# Altium integrated library LEMO Unipole And Multipole Type Connectors.IntLib: 1566 symbols (part 6 of 13) (continued)
## HEN.2F.319.MLNP
designator J?
Fixed receptacle, nut fixing, for printed circuit (back panel mounting), Key (N), 2F series, Multipole Type with 19 Contacts; Manufacturer: LEMO; PartNumber: HEN.2F.319.MLNP; Number of contacts: 19; Contact Diameter: 0.7 mm; AWG: 24; Test voltage Contact-Contact(Kv rms): 1.55; Test voltage Contact-Shell(Kv rms): 1.65; Rate Current(A): 5; DatasheetVersion: Jun-14; PackageReference: HEN.2F.319.MLNP; PackageDescription: Fixed receptacle, nut fixing, for printed circuit (back panel mounting), Key(N) for Printed Circuit; Supplier 1: Mouser; Supplier Part Number 1: 736-HEN2F319MLNP; Supplier 2: Digi-Key; Supplier Part Number 2: HEN.2F.319.MLNP-ND; ComponentLink1Description: Manufacturer URL; ComponentLink1URL: http://www.lemo.com; ComponentLink2Description: Datasheet; ComponentLink2URL: http://intra.lemo.ch/catalog/ROW/UK_English/f_series.pdf
footprint HEN.2F.319.MLNP (Socket, Female, Body 16mm dia. Height 21.6 mm, Through hole)
pins: 1, 2, 3, 4, 5, 6, 7, 8, 9, 10, 11, 12, 13, 14, 15, 16, 17, 18, 19, 21, 22, 23, 24

## HEN.2F.319.XLNP
designator J?
Fixed receptacle, nut fixing, for printed circuit (back panel mounting), Key (N), 2F series, Multipole Type with 19 Contacts; Manufacturer: LEMO; PartNumber: HEN.2F.319.XLNP; Number of contacts: 19; Contact Diameter: 0.7 mm; AWG: 24; Test voltage Contact-Contact(Kv rms): 1.55; Test voltage Contact-Shell(Kv rms): 1.65; Rate Current(A): 5; DatasheetVersion: Jun-14; PackageReference: HEN.2F.319.XLNP; PackageDescription: Fixed receptacle, nut fixing, for printed circuit (back panel mounting), Key(N) for Printed Circuit; Supplier 1: Mouser; Supplier Part Number 1: 736-HEN2F319XLNP; Supplier 2: Newark; Supplier Part Number 2: 28R4723; Supplier 3: Digi-Key; Supplier Part Number 3: HEN.2F.319.XLNP-ND; ComponentLink1Description: Manufacturer URL; ComponentLink1URL: http://www.lemo.com; ComponentLink2Description: Datasheet; ComponentLink2URL: http://intra.lemo.ch/catalog/ROW/UK_English/f_series.pdf
footprint HEN.2F.319.XLNP (Socket, Female, Body 16mm dia. Height 21.6 mm, Through hole)
pins: 1, 2, 3, 4, 5, 6, 7, 8, 9, 10, 11, 12, 13, 14, 15, 16, 17, 18, 19, 21, 22, 23, 24

## HEN.2F.319.XLNZ
designator J?
Fixed receptacle, nut fixing for printed circuit, Key (N), 2F series, Multipole Type with 19 Contacts; Manufacturer: LEMO; PartNumber: HEN.2F.319.XLNZ; Number of contacts: 19; Contact Diameter: 0.7 mm; AWG: 24; Test voltage Contact-Contact(Kv rms): 1.55; Test voltage Contact-Shell(Kv rms): 1.65; Rate Current(A): 5; DatasheetVersion: Jun-14; PackageReference: HEN.2F.319.XLNZ; PackageDescription: Fixed receptacle, nut fixing for printed circuit, Key(N) for Printed Circuit; ComponentLink1Description: Manufacturer URL; ComponentLink1URL: http://www.lemo.com; ComponentLink2Description: Datasheet; ComponentLink2URL: http://intra.lemo.ch/catalog/ROW/UK_English/f_series.pdf
footprint HEN.2F.319.XLNZ (Socket, Female, Through hole)
pins: 1, 2, 3, 4, 5, 6, 7, 8, 9, 10, 11, 12, 13, 14, 15, 16, 17, 18, 19, 21, 22, 23, 24

## HEN.2M.308.XLNP
designator J?
Fixed receptacle, nut fixing for printed circuit, watertight, Key (N), 2M series, Multipole Type with 8 Contacts; Manufacturer: LEMO; PartNumber: HEN.2M.308.XLNP; Number of contacts: 8; Contact Diameter: 0.9 mm; AWG: 22; Rated Current(A): 10; DatasheetVersion: Jun-14; PackageReference: HEN.2M.308.XLNP; PackageDescription: Fixed receptacle, nut fixing for printed circuit, watertight, Key(N) for Printed Circuit; Supplier 1: Mouser; Supplier Part Number 1: 736-HEN2M308XLNP; Supplier 2: Digi-Key; Supplier Part Number 2: 1124-1197-ND; ComponentLink1Description: Manufacturer URL; ComponentLink1URL: http://www.lemo.com; ComponentLink2Description: Datasheet; ComponentLink2URL: http://intra.lemo.ch/catalog/ROW/UK_English/M_series.pdf
footprint HEN.2M.308.XLNP (Socket, Female, Body 17mm dia. Height 20.8 mm, Through hole)
pins: 1, 2, 3, 4, 5, 6, 7, 8, 10, 11, 12, 13

## HEN.2M.310.XLNP
designator J?
Fixed receptacle, nut fixing for printed circuit, watertight, Key (N), 2M series, Multipole Type with 10 Contacts; Manufacturer: LEMO; PartNumber: HEN.2M.310.XLNP; Number of contacts: 10; Contact Diameter: 0.9 mm; AWG: 22; Rated Current(A): 8; DatasheetVersion: Jun-14; PackageReference: HEN.2M.310.XLNP; PackageDescription: Fixed receptacle, nut fixing for printed circuit, watertight, Key(N) for Printed Circuit; Supplier 1: Mouser; Supplier Part Number 1: 736-HEN2M310XLNP; Supplier 2: Digi-Key; Supplier Part Number 2: HEN.2M.310.XLNP-ND; ComponentLink1Description: Manufacturer URL; ComponentLink1URL: http://www.lemo.com; ComponentLink2Description: Datasheet; ComponentLink2URL: http://intra.lemo.ch/catalog/ROW/UK_English/M_series.pdf
footprint HEN.2M.310.XLNP (Socket, Female, Body 17mm dia. Height 20.8 mm, Through hole)
pins: 1, 2, 3, 4, 5, 6, 7, 8, 9, 10, 12, 13, 14, 15

## HEN.2M.312.XLNP
designator J?
Fixed receptacle, nut fixing for printed circuit, watertight, Key (N), 2M series, Multipole Type with 12 Contacts; Manufacturer: LEMO; PartNumber: HEN.2M.312.XLNP; Number of contacts: 12; Contact Diameter: 0.7 mm; AWG: 24; Rated Current(A): 7; DatasheetVersion: Jun-14; PackageReference: HEN.2M.312.XLNP; PackageDescription: Fixed receptacle, nut fixing for printed circuit, watertight, Key(N) for Printed Circuit; Supplier 1: Mouser; Supplier Part Number 1: 736-HEN2M312XLNP; Supplier 2: Farnell; Supplier Part Number 2: 2077488; Supplier 3: Digi-Key; Supplier Part Number 3: 1124-1198-ND; ComponentLink1Description: Manufacturer URL; ComponentLink1URL: http://www.lemo.com; ComponentLink2Description: Datasheet; ComponentLink2URL: http://intra.lemo.ch/catalog/ROW/UK_English/M_series.pdf
footprint HEN.2M.312.XLNP (Socket, Female, Body 17mm dia. Height 20.8 mm, Through hole)
pins: 1, 2, 3, 4, 5, 6, 7, 8, 9, 10, 11, 12, 14, 15, 16, 17

## HEN.2M.319.CLNP
designator J?
Fixed receptacle, nut fixing for printed circuit, watertight, Key (N), 2M series, Multipole Type with 19 Contacts; Manufacturer: LEMO; PartNumber: HEN.2M.319.CLNP; Number of contacts: 19; Contact Diameter: 0.7 mm; AWG: 24; Rated Current(A): 5; DatasheetVersion: Jun-14; PackageReference: HEN.2M.319.CLNP; PackageDescription: Fixed receptacle, nut fixing for printed circuit, watertight, Key(N) for Printed Circuit; ComponentLink1Description: Manufacturer URL; ComponentLink1URL: http://www.lemo.com; ComponentLink2Description: Datasheet; ComponentLink2URL: http://intra.lemo.ch/catalog/ROW/UK_English/M_series.pdf
footprint HEN.2M.319.CLNP (Socket, Female, Body 17mm dia. Height 20.8 mm, Through hole)
pins: 1, 2, 3, 4, 5, 6, 7, 8, 9, 10, 11, 12, 13, 14, 15, 16, 17, 18, 19, 21, 22, 23, 24

## HEN.2M.319.XLNP
designator J?
Fixed receptacle, nut fixing for printed circuit, watertight, Key (N), 2M series, Multipole Type with 19 Contacts; Manufacturer: LEMO; PartNumber: HEN.2M.319.XLNP; Number of contacts: 19; Contact Diameter: 0.7 mm; AWG: 24; Rated Current(A): 5; DatasheetVersion: Jun-14; PackageReference: HEN.2M.319.XLNP; PackageDescription: Fixed receptacle, nut fixing for printed circuit, watertight, Key(N) for Printed Circuit; Supplier 1: Mouser; Supplier Part Number 1: 736-HEN2M319XLNP; Supplier 2: Newark; Supplier Part Number 2: 28W2575; Supplier 3: Farnell; Supplier Part Number 3: 2077489; Supplier 4: Digi-Key; Supplier Part Number 4: HEN.2M.319.XLNP-ND; ComponentLink1Description: Manufacturer URL; ComponentLink1URL: http://www.lemo.com; ComponentLink2Description: Datasheet; ComponentLink2URL: http://intra.lemo.ch/catalog/ROW/UK_English/M_series.pdf
footprint HEN.2M.319.XLNP (Socket, Female, Body 17mm dia. Height 20.8 mm, Through hole)
pins: 1, 2, 3, 4, 5, 6, 7, 8, 9, 10, 11, 12, 13, 14, 15, 16, 17, 18, 19, 21, 22, 23, 24

## HEN.3F.322.CLNP
designator J?
Fixed receptacle, nut fixing, for printed circuit (back panel mounting), Key (N), 3F series, Multipole Type with 22 Contacts; Manufacturer: LEMO; PartNumber: HEN.3F.322.CLNP; Number of contacts: 22; Contact Diameter: 0.7 mm; AWG: 24; Test voltage Contact-Contact(Kv rms): 1.7; Test voltage Contact-Shell(Kv rms): 1.45; Rate Current(A): 5.5; DatasheetVersion: Jun-14; PackageReference: HEN.3F.322.CLNP; PackageDescription: Fixed receptacle, nut fixing, for printed circuit (back panel mounting), Key(N) for Printed Circuit; ComponentLink1Description: Manufacturer URL; ComponentLink1URL: http://www.lemo.com; ComponentLink2Description: Datasheet; ComponentLink2URL: http://intra.lemo.ch/catalog/ROW/UK_English/f_series.pdf
footprint HEN.3F.322.CLNP (Socket, Female, Body 18mm dia. Height 21.6 mm, Through hole)
pins: 1, 2, 3, 4, 5, 6, 7, 8, 9, 10, 11, 12, 13, 14, 15, 16, 17, 18, 19, 20, 21, 22, 24, 25, 26, 27

## HEN.3F.322.XLNP
designator J?
Fixed receptacle, nut fixing, for printed circuit (back panel mounting), Key (N), 3F series, Multipole Type with 22 Contacts; Manufacturer: LEMO; PartNumber: HEN.3F.322.XLNP; Number of contacts: 22; Contact Diameter: 0.7 mm; AWG: 24; Test voltage Contact-Contact(Kv rms): 1.7; Test voltage Contact-Shell(Kv rms): 1.45; Rate Current(A): 5.5; DatasheetVersion: Jun-14; PackageReference: HEN.3F.322.XLNP; PackageDescription: Fixed receptacle, nut fixing, for printed circuit (back panel mounting), Key(N) for Printed Circuit; Supplier 1: Mouser; Supplier Part Number 1: 736-HEN3F322XLNP; Supplier 2: Digi-Key; Supplier Part Number 2: HEN.3F.322.XLNP-ND; ComponentLink1Description: Manufacturer URL; ComponentLink1URL: http://www.lemo.com; ComponentLink2Description: Datasheet; ComponentLink2URL: http://intra.lemo.ch/catalog/ROW/UK_English/f_series.pdf
footprint HEN.3F.322.XLNP (Socket, Female, Body 18mm dia. Height 21.6 mm, Through hole)
pins: 1, 2, 3, 4, 5, 6, 7, 8, 9, 10, 11, 12, 13, 14, 15, 16, 17, 18, 19, 20, 21, 22, 24, 25, 26, 27

## HEN.3F.322.XLNPS
designator J?
Fixed receptacle, nut fixing, for printed circuit (back panel mounting), Key (N), 3F series, Multipole Type with 22 Contacts; Manufacturer: LEMO; PartNumber: HEN.3F.322.XLNPS; Number of contacts: 22; Contact Diameter: 0.7 mm; AWG: 24; Test voltage Contact-Contact(Kv rms): 1.7; Test voltage Contact-Shell(Kv rms): 1.45; Rate Current(A): 5.5; DatasheetVersion: Jun-14; PackageReference: HEN.3F.322.XLNPS; PackageDescription: Fixed receptacle, nut fixing, for printed circuit (back panel mounting), Key(N) for Printed Circuit; ComponentLink1Description: Manufacturer URL; ComponentLink1URL: http://www.lemo.com; ComponentLink2Description: Datasheet; ComponentLink2URL: http://intra.lemo.ch/catalog/ROW/UK_English/f_series.pdf
footprint HEN.3F.322.XLNPS (Socket, Female, Body 18mm dia. Height 21.6 mm, Through hole)
pins: 1, 2, 3, 4, 5, 6, 7, 8, 9, 10, 11, 12, 13, 14, 15, 16, 17, 18, 19, 20, 21, 22, 24, 25, 26, 27

## HEN.3F.330.CLNP
designator J?
Fixed receptacle, nut fixing, for printed circuit (back panel mounting), Key (N), 3F series, Multipole Type with 30 Contacts; Manufacturer: LEMO; PartNumber: HEN.3F.330.CLNP; Number of contacts: 30; Contact Diameter: 0.7 mm; AWG: 24; Test voltage Contact-Contact(Kv rms): 1.35; Test voltage Contact-Shell(Kv rms): 1.2; Rate Current(A): 3.5; DatasheetVersion: Jun-14; PackageReference: HEN.3F.330.CLNP; PackageDescription: Fixed receptacle, nut fixing, for printed circuit (back panel mounting), Key(N) for Printed Circuit; ComponentLink1Description: Manufacturer URL; ComponentLink1URL: http://www.lemo.com; ComponentLink2Description: Datasheet; ComponentLink2URL: http://intra.lemo.ch/catalog/ROW/UK_English/f_series.pdf
footprint HEN.3F.330.CLNP (Socket, Female, Body 18mm dia. Height 21.6 mm, Through hole)
pins: 1, 2, 3, 4, 5, 6, 7, 8, 9, 10, 11, 12, 13, 14, 15, 16, 17, 18, 19, 20, 21, 22, 23, 24, 25, 26, 27, 28, 29, 30, 32, 33, 34, 35

## HEN.3F.330.XLNP
designator J?
Fixed receptacle, nut fixing, for printed circuit (back panel mounting), Key (N), 3F series, Multipole Type with 30 Contacts; Manufacturer: LEMO; PartNumber: HEN.3F.330.XLNP; Number of contacts: 30; Contact Diameter: 0.7 mm; AWG: 24; Test voltage Contact-Contact(Kv rms): 1.35; Test voltage Contact-Shell(Kv rms): 1.2; Rate Current(A): 3.5; DatasheetVersion: Jun-14; PackageReference: HEN.3F.330.XLNP; PackageDescription: Fixed receptacle, nut fixing, for printed circuit (back panel mounting), Key(N) for Printed Circuit; Supplier 1: Mouser; Supplier Part Number 1: 736-HEN3F330XLNP; Supplier 2: Newark; Supplier Part Number 2: 38T2389; Supplier 3: Digi-Key; Supplier Part Number 3: HEN.3F.330.XLNP-ND; ComponentLink1Description: Manufacturer URL; ComponentLink1URL: http://www.lemo.com; ComponentLink2Description: Datasheet; ComponentLink2URL: http://intra.lemo.ch/catalog/ROW/UK_English/f_series.pdf
footprint HEN.3F.330.XLNP (Socket, Female, Body 18mm dia. Height 21.6 mm, Through hole)
pins: 1, 2, 3, 4, 5, 6, 7, 8, 9, 10, 11, 12, 13, 14, 15, 16, 17, 18, 19, 20, 21, 22, 23, 24, 25, 26, 27, 28, 29, 30, 32, 33, 34, 35

## HEN.3F.330.XLNPS
designator J?
Fixed receptacle, nut fixing, for printed circuit (back panel mounting), Key (N), 3F series, Multipole Type with 30 Contacts; Manufacturer: LEMO; PartNumber: HEN.3F.330.XLNPS; Number of contacts: 30; Contact Diameter: 0.7 mm; AWG: 24; Test voltage Contact-Contact(Kv rms): 1.35; Test voltage Contact-Shell(Kv rms): 1.2; Rate Current(A): 3.5; DatasheetVersion: Jun-14; PackageReference: HEN.3F.330.XLNPS; PackageDescription: Fixed receptacle, nut fixing, for printed circuit (back panel mounting), Key(N) for Printed Circuit; Supplier 1: Mouser; Supplier Part Number 1: 736-HEN.3F.330.XLNPS; Supplier 2: Newark; Supplier Part Number 2: 66T8368; Supplier 3: Digi-Key; Supplier Part Number 3: HEN.3F.330.XLNPS-ND; ComponentLink1Description: Manufacturer URL; ComponentLink1URL: http://www.lemo.com; ComponentLink2Description: Datasheet; ComponentLink2URL: http://intra.lemo.ch/catalog/ROW/UK_English/f_series.pdf
footprint HEN.3F.330.XLNPS (Socket, Female, Body 18mm dia. Height 21.6 mm, Through hole)
pins: 1, 2, 3, 4, 5, 6, 7, 8, 9, 10, 11, 12, 13, 14, 15, 16, 17, 18, 19, 20, 21, 22, 23, 24, 25, 26, 27, 28, 29, 30, 32, 33, 34, 35

## HEN.3M.322.XLNP
designator J?
Fixed receptacle, nut fixing for printed circuit, watertight, Key (N), 3M series, Multipole Type with 22 Contacts; Manufacturer: LEMO; PartNumber: HEN.3M.322.XLNP; Number of contacts: 22; Contact Diameter: 0.7 mm; AWG: 24; Rated Current(A): 4; DatasheetVersion: Jun-14; PackageReference: HEN.3M.322.XLNP; PackageDescription: Fixed receptacle, nut fixing for printed circuit, watertight, Key(N) for Printed Circuit; ComponentLink1Description: Manufacturer URL; ComponentLink1URL: http://www.lemo.com; ComponentLink2Description: Datasheet; ComponentLink2URL: http://intra.lemo.ch/catalog/ROW/UK_English/M_series.pdf
footprint HEN.3M.322.XLNP (Socket, Female, Body 19mm dia. Height 20.8 mm, Through hole)
pins: 1, 2, 3, 4, 5, 6, 7, 8, 9, 10, 11, 12, 13, 14, 15, 16, 17, 18, 19, 20, 21, 22, 24, 25, 26, 27

## HEN.3M.330.XLNP
designator J?
Fixed receptacle, nut fixing for printed circuit, watertight, Key (N), 3M series, Multipole Type with 30 Contacts; Manufacturer: LEMO; PartNumber: HEN.3M.330.XLNP; Number of contacts: 30; Contact Diameter: 0.7 mm; AWG: 24; Rated Current(A): 3.5; DatasheetVersion: Jun-14; PackageReference: HEN.3M.330.XLNP; PackageDescription: Fixed receptacle, nut fixing for printed circuit, watertight, Key(N) for Printed Circuit; Supplier 1: Mouser; Supplier Part Number 1: 736-HEN3M330XLNP; Supplier 2: Newark; Supplier Part Number 2: 47W6199; Supplier 3: Digi-Key; Supplier Part Number 3: 1124-1199-ND; ComponentLink1Description: Manufacturer URL; ComponentLink1URL: http://www.lemo.com; ComponentLink2Description: Datasheet; ComponentLink2URL: http://intra.lemo.ch/catalog/ROW/UK_English/M_series.pdf
footprint HEN.3M.330.XLNP (Socket, Female, Body 19mm dia. Height 20.8 mm, Through hole)
pins: 1, 2, 3, 4, 5, 6, 7, 8, 9, 10, 11, 12, 13, 14, 15, 16, 17, 18, 19, 20, 21, 22, 23, 24, 25, 26, 27, 28, 29, 30, 32, 33, 34, 35

## HEN.FF.303.XLNP
designator J?
Fixed receptacle, nut fixing, for printed circuit (back panel mounting), Key (N), FF series, Multipole Type with; Manufacturer: LEMO; PartNumber: HEN.FF.303.XLNP; Number of contacts: 0; Contact Diameter: 0.5 mm; AWG: 28; Test voltage Contact-Contact(Kv rms): 1.35; Test voltage Contact-Shell(Kv rms): 1.1; Rate Current(A): 3; DatasheetVersion: Jun-14; PackageReference: HEN.FF.303.XLNP; PackageDescription: Fixed receptacle, nut fixing, for printed circuit (back panel mounting), Key(N) for Printed Circuit; ComponentLink1Description: Manufacturer URL; ComponentLink1URL: http://www.lemo.com; ComponentLink2Description: Datasheet; ComponentLink2URL: http://intra.lemo.ch/catalog/ROW/UK_English/f_series.pdf
footprint HEN.FF.303.XLNP (Socket, Female, Through hole)
pins: 1, 2, 3, 5, 6, 7, 8

## HEN.FF.304.SLNP
designator J?
Fixed receptacle, nut fixing, for printed circuit (back panel mounting), Key (N), FF series, Multipole Type with; Manufacturer: LEMO; PartNumber: HEN.FF.304.SLNP; Number of contacts: 0; Contact Diameter: 0.5 mm; AWG: 28; Test voltage Contact-Contact(Kv rms): 1.05; Rate Current(A): 2; DatasheetVersion: Jun-14; PackageReference: HEN.FF.304.SLNP; PackageDescription: Fixed receptacle, nut fixing, for printed circuit (back panel mounting), Key(N) for Printed Circuit; Test voltage Contact-Shell(Kv rms): 1.05; ComponentLink1Description: Manufacturer URL; ComponentLink1URL: http://www.lemo.com; ComponentLink2Description: Datasheet; ComponentLink2URL: http://intra.lemo.ch/catalog/ROW/UK_English/f_series.pdf
footprint HEN.FF.304.SLNP (Socket, Female, Through hole)
pins: 1, 2, 3, 4, 6, 7, 8, 9

## HEN.FF.304.XLNP
designator J?
Fixed receptacle, nut fixing, for printed circuit (back panel mounting), Key (N), FF series, Multipole Type with; Manufacturer: LEMO; PartNumber: HEN.FF.304.XLNP; Number of contacts: 0; Contact Diameter: 0.5 mm; AWG: 28; Test voltage Contact-Contact(Kv rms): 1.05; Rate Current(A): 2; DatasheetVersion: Jun-14; PackageReference: HEN.FF.304.XLNP; PackageDescription: Fixed receptacle, nut fixing, for printed circuit (back panel mounting), Key(N) for Printed Circuit; Supplier 1: Mouser; Supplier Part Number 1: 736-HENFF304XLNP; Supplier 2: Digi-Key; Supplier Part Number 2: HEN.FF.304.XLNP-ND; Test voltage Contact-Shell(Kv rms): 1.05; ComponentLink1Description: Manufacturer URL; ComponentLink1URL: http://www.lemo.com; ComponentLink2Description: Datasheet; ComponentLink2URL: http://intra.lemo.ch/catalog/ROW/UK_English/f_series.pdf
footprint HEN.FF.304.XLNP (Socket, Female, Through hole)
pins: 1, 2, 3, 4, 6, 7, 8, 9

## HEP.0F.303.CLNP
designator J?
Fixed receptacle, nut fixing, for printed circuit (back panel mounting), Key (P), 0F series, Multipole Type with 3 Contacts; Manufacturer: LEMO; PartNumber: HEP.0F.303.CLNP; Number of contacts: 3; Contact Diameter: 0.9 mm; AWG: 22; Test voltage Contact-Contact(Kv rms): 1.7; Test voltage Contact-Shell(Kv rms): 1.6; Rate Current(A): 8; DatasheetVersion: Jun-14; PackageReference: HEP.0F.303.CLNP; PackageDescription: Fixed receptacle, nut fixing, for printed circuit (back panel mounting), Key(P) for Printed Circuit; ComponentLink1Description: Manufacturer URL; ComponentLink1URL: http://www.lemo.com; ComponentLink2Description: Datasheet; ComponentLink2URL: http://intra.lemo.ch/catalog/ROW/UK_English/f_series.pdf
footprint HEP.0F.303.CLNP (Socket, Female, Body 10mm dia. Height 21.6 mm, Through hole)
pins: 1, 2, 3, 5, 6, 7, 8

## HEP.0F.303.XLNP
designator J?
Fixed receptacle, nut fixing, for printed circuit (back panel mounting), Key (P), 0F series, Multipole Type with 3 Contacts; Manufacturer: LEMO; PartNumber: HEP.0F.303.XLNP; Number of contacts: 3; Contact Diameter: 0.9 mm; AWG: 22; Test voltage Contact-Contact(Kv rms): 1.7; Test voltage Contact-Shell(Kv rms): 1.6; Rate Current(A): 8; DatasheetVersion: Jun-14; PackageReference: HEP.0F.303.XLNP; PackageDescription: Fixed receptacle, nut fixing, for printed circuit (back panel mounting), Key(P) for Printed Circuit; Supplier 1: Mouser; Supplier Part Number 1: 736-HEP0F303XLNP; Supplier 2: Digi-Key; Supplier Part Number 2: HEP.0F.303.XLNP-ND; ComponentLink1Description: Manufacturer URL; ComponentLink1URL: http://www.lemo.com; ComponentLink2Description: Datasheet; ComponentLink2URL: http://intra.lemo.ch/catalog/ROW/UK_English/f_series.pdf
footprint HEP.0F.303.XLNP (Socket, Female, Body 10mm dia. Height 21.6 mm, Through hole)
pins: 1, 2, 3, 5, 6, 7, 8

## HEP.0F.304.XLNP
designator J?
Fixed receptacle, nut fixing, for printed circuit (back panel mounting), Key (P), 0F series, Multipole Type with 4 Contacts; Manufacturer: LEMO; PartNumber: HEP.0F.304.XLNP; Number of contacts: 4; Contact Diameter: 0.7 mm; AWG: 24; Test voltage Contact-Contact(Kv rms): 1.35; Test voltage Contact-Shell(Kv rms): 1.1; Rate Current(A): 7; DatasheetVersion: Jun-14; PackageReference: HEP.0F.304.XLNP; PackageDescription: Fixed receptacle, nut fixing, for printed circuit (back panel mounting), Key(P) for Printed Circuit; ComponentLink1Description: Manufacturer URL; ComponentLink1URL: http://www.lemo.com; ComponentLink2Description: Datasheet; ComponentLink2URL: http://intra.lemo.ch/catalog/ROW/UK_English/f_series.pdf
footprint HEP.0F.304.XLNP (Socket, Female, Body 10mm dia. Height 21.6 mm, Through hole)
pins: 1, 2, 3, 4, 6, 7, 8, 9

## HEP.0F.305.CLNP
designator J?
Fixed receptacle, nut fixing, for printed circuit (back panel mounting), Key (P), 0F series, Multipole Type with 5 Contacts; Manufacturer: LEMO; PartNumber: HEP.0F.305.CLNP; Number of contacts: 5; Contact Diameter: 0.7 mm; AWG: 24; Test voltage Contact-Contact(Kv rms): 1.25; Test voltage Contact-Shell(Kv rms): 1.2; Rate Current(A): 6.5; DatasheetVersion: Jun-14; PackageReference: HEP.0F.305.CLNP; PackageDescription: Fixed receptacle, nut fixing, for printed circuit (back panel mounting), Key(P) for Printed Circuit; ComponentLink1Description: Manufacturer URL; ComponentLink1URL: http://www.lemo.com; ComponentLink2Description: Datasheet; ComponentLink2URL: http://intra.lemo.ch/catalog/ROW/UK_English/f_series.pdf
footprint HEP.0F.305.CLNP (Socket, Female, Body 10mm dia. Height 21.6 mm, Through hole)
pins: 1, 2, 3, 4, 5, 7, 8, 9, 10

## HEP.0F.305.XLNP
designator J?
Fixed receptacle, nut fixing, for printed circuit (back panel mounting), Key (P), 0F series, Multipole Type with 5 Contacts; Manufacturer: LEMO; PartNumber: HEP.0F.305.XLNP; Number of contacts: 5; Contact Diameter: 0.7 mm; AWG: 24; Test voltage Contact-Contact(Kv rms): 1.25; Test voltage Contact-Shell(Kv rms): 1.2; Rate Current(A): 6.5; DatasheetVersion: Jun-14; PackageReference: HEP.0F.305.XLNP; PackageDescription: Fixed receptacle, nut fixing, for printed circuit (back panel mounting), Key(P) for Printed Circuit; ComponentLink1Description: Manufacturer URL; ComponentLink1URL: http://www.lemo.com; ComponentLink2Description: Datasheet; ComponentLink2URL: http://intra.lemo.ch/catalog/ROW/UK_English/f_series.pdf
footprint HEP.0F.305.XLNP (Socket, Female, Body 10mm dia. Height 21.6 mm, Through hole)
pins: 1, 2, 3, 4, 5, 7, 8, 9, 10

## HEP.0M.302.XLNP
designator J?
Fixed receptacle, nut fixing for printed circuit, watertight, Key (P), 0M series, Multipole Type with 2 Contacts; Manufacturer: LEMO; PartNumber: HEP.0M.302.XLNP; Number of contacts: 2; Contact Diameter: 0.9 mm; AWG: 22; Rated Current(A): 10; DatasheetVersion: Jun-14; PackageReference: HEP.0M.302.XLNP; PackageDescription: Fixed receptacle, nut fixing for printed circuit, watertight, Key(P) for Printed Circuit; ComponentLink1Description: Manufacturer URL; ComponentLink1URL: http://www.lemo.com; ComponentLink2Description: Datasheet; ComponentLink2URL: http://intra.lemo.ch/catalog/ROW/UK_English/M_series.pdf
footprint HEP.0M.302.XLNP (Socket, Female, Body 13mm dia. Height 20.8 mm, Through hole)
pins: 1, 2, 4, 5, 6, 7

## HEP.0M.303.XLNP
designator J?
Fixed receptacle, nut fixing for printed circuit, watertight, Key (P), 0M series, Multipole Type with 3 Contacts; Manufacturer: LEMO; PartNumber: HEP.0M.303.XLNP; Number of contacts: 3; Contact Diameter: 0.9 mm; AWG: 22; Rated Current(A): 8; DatasheetVersion: Jun-14; PackageReference: HEP.0M.303.XLNP; PackageDescription: Fixed receptacle, nut fixing for printed circuit, watertight, Key(P) for Printed Circuit; ComponentLink1Description: Manufacturer URL; ComponentLink1URL: http://www.lemo.com; ComponentLink2Description: Datasheet; ComponentLink2URL: http://intra.lemo.ch/catalog/ROW/UK_English/M_series.pdf
footprint HEP.0M.303.XLNP (Socket, Female, Body 13mm dia. Height 20.8 mm, Through hole)
pins: 1, 2, 3, 5, 6, 7, 8

## HEP.0M.304.XLNP
designator J?
Fixed receptacle, nut fixing for printed circuit, watertight, Key (P), 0M series, Multipole Type with 4 Contacts; Manufacturer: LEMO; PartNumber: HEP.0M.304.XLNP; Number of contacts: 4; Contact Diameter: 0.7 mm; AWG: 24; Rated Current(A): 7; DatasheetVersion: Jun-14; PackageReference: HEP.0M.304.XLNP; PackageDescription: Fixed receptacle, nut fixing for printed circuit, watertight, Key(P) for Printed Circuit; ComponentLink1Description: Manufacturer URL; ComponentLink1URL: http://www.lemo.com; ComponentLink2Description: Datasheet; ComponentLink2URL: http://intra.lemo.ch/catalog/ROW/UK_English/M_series.pdf
footprint HEP.0M.304.XLNP (Socket, Female, Body 13mm dia. Height 20.8 mm, Through hole)
pins: 1, 2, 3, 4, 6, 7, 8, 9

## HEP.0M.305.XLNP
designator J?
Fixed receptacle, nut fixing for printed circuit, watertight, Key (P), 0M series, Multipole Type with 5 Contacts; Manufacturer: LEMO; PartNumber: HEP.0M.305.XLNP; Number of contacts: 5; Contact Diameter: 0.7 mm; AWG: 24; Rated Current(A): 6.5; DatasheetVersion: Jun-14; PackageReference: HEP.0M.305.XLNP; PackageDescription: Fixed receptacle, nut fixing for printed circuit, watertight, Key(P) for Printed Circuit; ComponentLink1Description: Manufacturer URL; ComponentLink1URL: http://www.lemo.com; ComponentLink2Description: Datasheet; ComponentLink2URL: http://intra.lemo.ch/catalog/ROW/UK_English/M_series.pdf
footprint HEP.0M.305.XLNP (Socket, Female, Body 13mm dia. Height 20.8 mm, Through hole)
pins: 1, 2, 3, 4, 5, 7, 8, 9, 10

## HEP.1F.308.CLNP
designator J?
Fixed receptacle, nut fixing, for printed circuit (back panel mounting), Key (P), 1F series, Multipole Type with 8 Contacts; Manufacturer: LEMO; PartNumber: HEP.1F.308.CLNP; Number of contacts: 8; Contact Diameter: 0.7 mm; AWG: 24; Test voltage Contact-Contact(Kv rms): 1.3; Rate Current(A): 5; DatasheetVersion: Jun-14; PackageReference: HEP.1F.308.CLNP; PackageDescription: Fixed receptacle, nut fixing, for printed circuit (back panel mounting), Key(P) for Printed Circuit; Test voltage Contact-Shell(Kv rms): 1.3; ComponentLink1Description: Manufacturer URL; ComponentLink1URL: http://www.lemo.com; ComponentLink2Description: Datasheet; ComponentLink2URL: http://intra.lemo.ch/catalog/ROW/UK_English/f_series.pdf
footprint HEP.1F.308.CLNP (Socket, Female, Body 13mm dia. Height 21.6 mm, Through hole)
pins: 1, 2, 3, 4, 5, 6, 7, 8, 10, 11, 12, 13

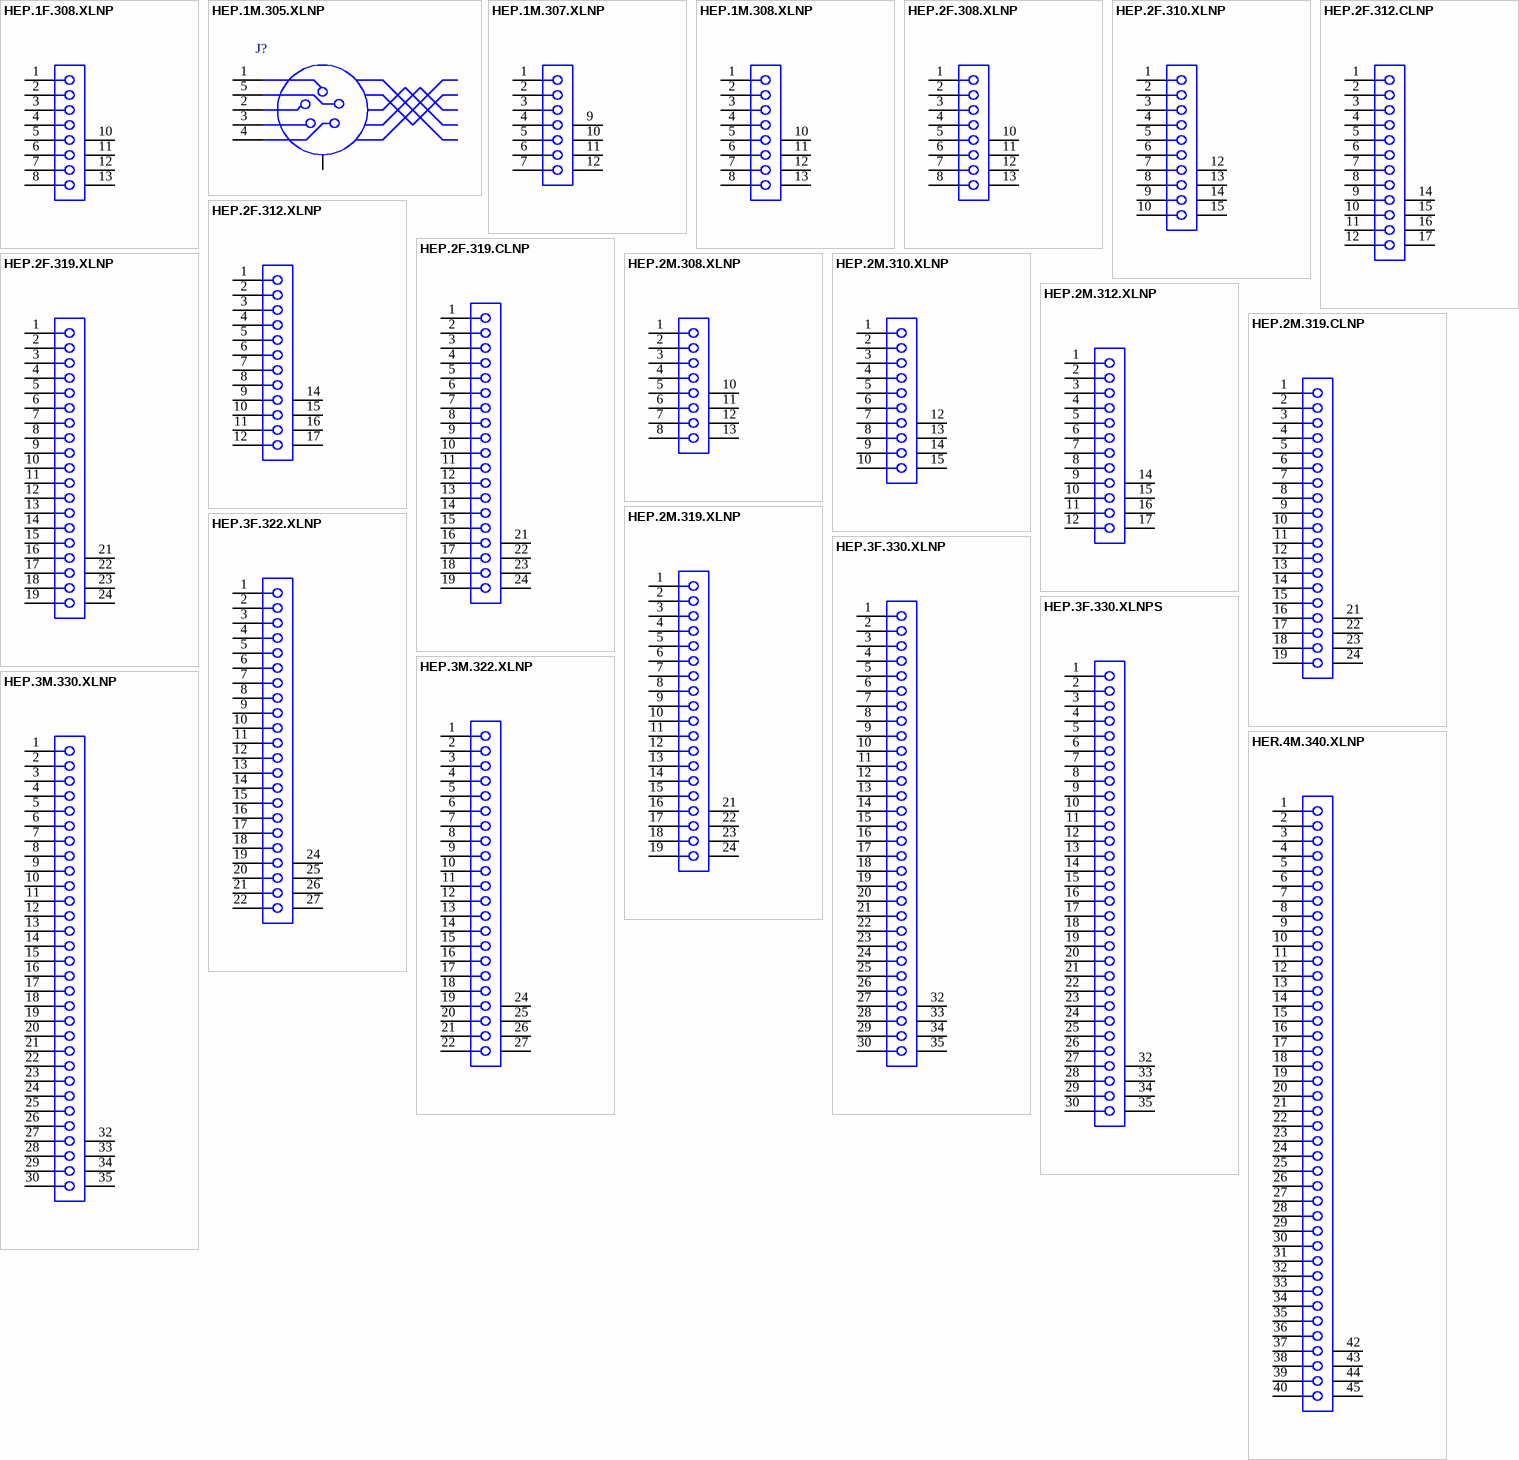
[diagram p20: symbols HEP.1F.308.XLNP to HER.4M.340.XLNP]

## HEP.1F.308.XLNP
designator J?
Fixed receptacle, nut fixing, for printed circuit (back panel mounting), Key (P), 1F series, Multipole Type with 8 Contacts; Manufacturer: LEMO; PartNumber: HEP.1F.308.XLNP; Number of contacts: 8; Contact Diameter: 0.7 mm; AWG: 24; Test voltage Contact-Contact(Kv rms): 1.3; Rate Current(A): 5; DatasheetVersion: Jun-14; PackageReference: HEP.1F.308.XLNP; PackageDescription: Fixed receptacle, nut fixing, for printed circuit (back panel mounting), Key(P) for Printed Circuit; Supplier 1: Mouser; Supplier Part Number 1: 736-HEP1F308XLNP; Supplier 2: Digi-Key; Supplier Part Number 2: HEP.1F.308.XLNP-ND; Test voltage Contact-Shell(Kv rms): 1.3; ComponentLink1Description: Manufacturer URL; ComponentLink1URL: http://www.lemo.com; ComponentLink2Description: Datasheet; ComponentLink2URL: http://intra.lemo.ch/catalog/ROW/UK_English/f_series.pdf
footprint HEP.1F.308.XLNP (Socket, Female, Body 13mm dia. Height 21.6 mm, Through hole)
pins: 1, 2, 3, 4, 5, 6, 7, 8, 10, 11, 12, 13

## HEP.1M.305.XLNP
designator J?
Fixed receptacle, nut fixing for printed circuit, watertight, Key (P), 1M series, Multipole Type with 5 Contacts; Manufacturer: LEMO; PartNumber: HEP.1M.305.XLNP; Number of contacts: 5; Contact Diameter: 0.9 mm; AWG: 22; Rated Current(A): 9; DatasheetVersion: Jun-14; PackageReference: HEP.1M.305.XLNP; PackageDescription: Fixed receptacle, nut fixing for printed circuit, watertight, Key(P) for Printed Circuit; Supplier 1: Mouser; Supplier Part Number 1: 736-HEP1M305XLNP; Supplier 2: Digi-Key; Supplier Part Number 2: HEP.1M.305.XLNP-ND; ComponentLink1Description: Manufacturer URL; ComponentLink1URL: http://www.lemo.com; ComponentLink2Description: Datasheet; ComponentLink2URL: http://intra.lemo.ch/catalog/ROW/UK_English/M_series.pdf
footprint HEP.1M.305.XLNP (Socket, Female, Body 14mm dia. Height 20.8 mm, Through hole)
pins: 1, 2, 3, 4, 5, 7, 8, 9, 10